# Altium footprint library Tomra_Cadstar_Footprints.PcbLib: 373 footprints (part 7 of 24)
Each footprint in its own frame and in the unit in brackets; x right, y up, seen from the top. Pads: shape width x height; smd on the part's side, far side on the other; paste and mask are expansions set on the pad; w line width, h text height; cw(c..) or ccw(c..) is an arc to the next point about the centre after c.
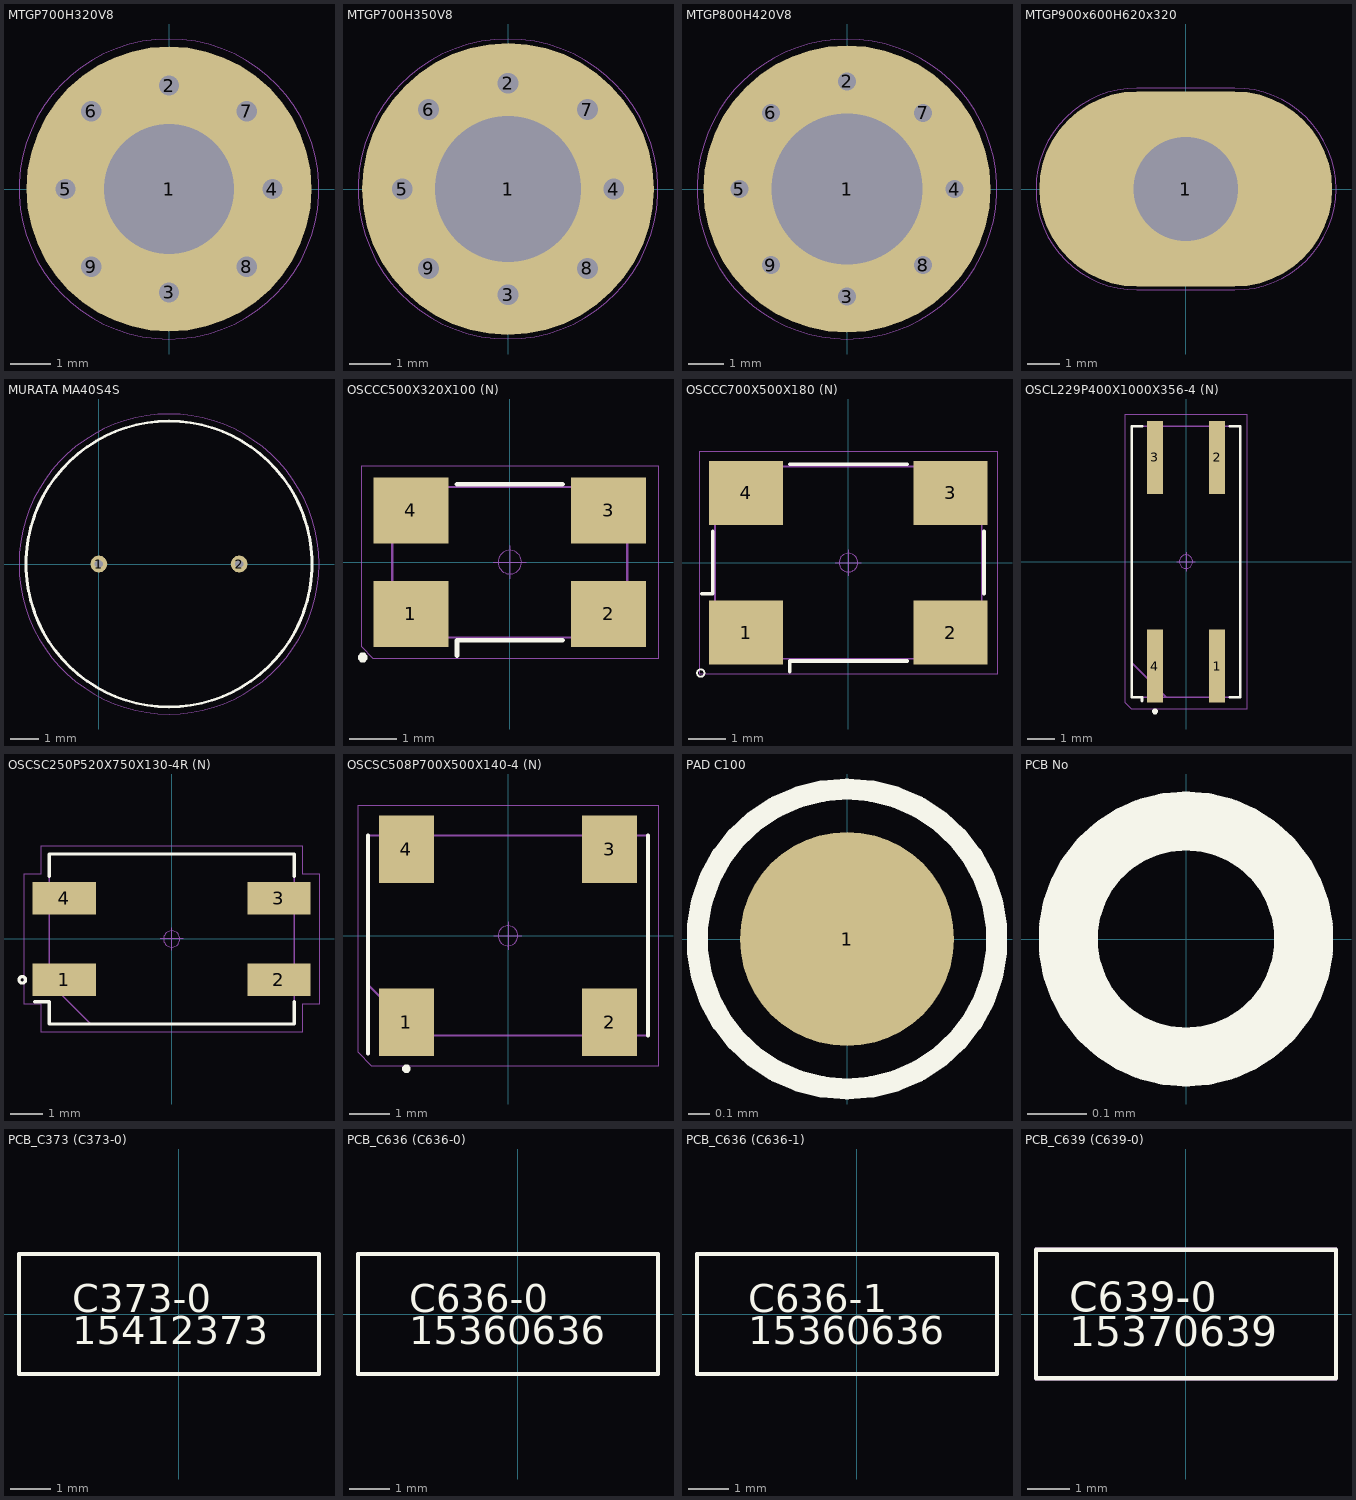
[diagram p6: the footprints below, top view; thin cyan lines are the x and y axes]

## MTGP700H320V8 [mm]
pads (9):
  round 7 / inner round 1.524 / far side round 7 hole 3.2 paste+0 mask+0: 1(0,0)
  round 0.9 / inner round 1.524 / far side round 0.9 hole 0.5 paste+0 mask+0: 2(0,2.54) 3(0,-2.54) 4(2.54,0) 5(-2.54,0) 6(-1.905,1.905) 7(1.905,1.905) 8(1.905,-1.905) 9(-1.905,-1.905)
Top Elec:
  lines w0.1: -1.905,1.905 -2.54,0 -1.905,-1.905 0,-2.54 1.905,-1.905 2.54,0 1.905,1.905 0,2.54 0,0
Top Assembly:
  lines w0.05: 0,-3.4 cw(c0,0) 0,3.4 cw(c0,0) 0,-3.4
  text ".Designator" at 0,3.683 h0.7
Top Placement:
  lines w0.01: 0,-3.683 cw(c0,0) 0,3.683 cw(c0,0) 0,-3.683

## MTGP700H350V8 [mm]
pads (9):
  round 7 / inner round 1.524 / far side round 7 hole 3.5 paste+0 mask+0: 1(0,0)
  round 0.9 / inner round 1.524 / far side round 0.9 hole 0.5 paste+0 mask+0: 2(0,2.54) 3(0,-2.54) 4(2.54,0) 5(-2.54,0) 6(-1.905,1.905) 7(1.905,1.905) 8(1.905,-1.905) 9(-1.905,-1.905)
Top Elec:
  lines w0.3: 0,0 0,2.54 ; 0,2.54 1.905,1.905 2.54,0 1.905,-1.905 0,-2.54 -1.905,-1.905 -2.54,0 -1.905,1.905 0,2.54
Top Assembly:
  lines w0.05: 0,-3.4 cw(c0,0) 0,3.4 cw(c0,0) 0,-3.4
  text ".Designator" at 0,3.6 h0.7
Top Placement:
  lines w0.01: 0,-3.6 cw(c0,0) 0,3.6 cw(c0,0) 0,-3.6

## MTGP800H420V8 [mm]
pads (9):
  round 8 / inner round 1.524 / far side round 8 hole 4.2 paste+0 mask+0: 1(0,0)
  round 0.9 / inner round 1.524 / far side round 0.9 hole 0.5 paste+0 mask+0: 2(0,3) 3(0,-3) 4(3,0) 5(-3,0) 6(-2.121,2.121) 7(2.12,2.12) 8(2.12,-2.12) 9(-2.12,-2.12)
Top Elec:
  lines w0.1: -2.121,2.121 -3,0 -2.12,-2.12 0,-3 2.12,-2.12 3,0 2.12,2.12 0,3 0,0
Top Assembly:
  lines w0.05: 0,-3.9 cw(c0,0) 0,3.9 cw(c0,0) 0,-3.9
  text ".Designator" at 0,3.683 h0.7
Top Placement:
  lines w0.01: 0,-4.18 cw(c0,0) 0,4.18 cw(c0,0) 0,-4.18

## MTGP900x600H620x320 [mm]
pads (1):
  oval 9x6 / inner round 1.524 / far side oval 9x6 hole 3.2 paste+0 mask+0: 1(0,0)
Top Silk:
  text ".Designator" at -1.5,3.1 h0.7
Top Assembly:
  lines w0.05: -1.5,-2.9 1.5,-2.9 ccw(c1.494,0) 1.5,2.9 -1.5,2.9 ccw(c-1.506,0) -1.5,-2.9
Top Placement:
  lines w0.01: -1.5,-3.1 1.5,-3.1 ccw(c1.519,0) 1.5,3.1 -1.5,3.1 ccw(c-1.501,0) -1.5,-3.1

## MURATA MA40S4S [mm]
height 7.4
pads (2):
  round 0.6 / inner round 1.524 / far side round 0.6 hole 0.3 paste+0 mask+0: 1(0,0) 2(5,0)
Top Silk:
  lines w0.1: 2.5,-5.1 cw(c2.5,0) 2.5,5.1 cw(c2.5,0) 2.5,-5.1
Top Assembly:
  lines w0.05: 2.5,-5.1 cw(c2.5,0) 2.5,5.1 cw(c2.5,0) 2.5,-5.1
Top Placement:
  lines w0.01: 2.5,-5.35 cw(c2.5,0) 2.5,5.35 cw(c2.5,0) 2.5,-5.35
  text ".Designator" at 2.5,5.1 h0.7

## OSCCC500X320X100 (N) [mm]
height 1
pads (4):
  rect 1.6x1.4 smd paste+0 mask+0: 1(-2.1,-1.1) 2(2.1,-1.1) 3(2.1,1.1) 4(-2.1,1.1)
Top Silk:
  region: -3.226,-2.026 -3.226,-1.985 -3.168,-1.926 -3.085,-1.926 -3.026,-1.985 -3.026,-2.026 -3.026,-2.068 -3.085,-2.126 -3.168,-2.126 -3.226,-2.068
  lines w0.1: -1.12,-1.99 -1.12,-1.66 1.12,-1.66 ; -1.12,1.66 1.12,1.66
  text ".Designator" at -3.599,-0.35 h0.7
Top Assembly:
  lines w0.05: -2.5,-0.533 -1.433,-1.6 2.5,-1.6 2.5,1.6 -2.5,1.6 -2.5,-0.533
Top Placement:
  lines w0.01: -0.35,0 0.35,0 ; 0,-0.35 0,0.35 ; -3.15,-1.8 -2.9,-2.05 3.15,-2.05 3.15,2.05 -3.15,2.05 -3.15,-1.8 ; -0.25,0 cw(c0,0) 0.25,0 cw(c0,0) -0.25,0

## OSCCC700X500X180 (N) [mm]
height 1.8
pads (4):
  rect 1.98x1.72 smd paste+0 mask+0: 1(-2.745,-1.875) 2(2.745,-1.875) 3(2.745,1.875) 4(-2.745,1.875)
Top Silk:
  lines w0.05: -4.061,-2.961 cw(c-3.961,-2.961) -3.861,-2.961 cw(c-3.961,-2.961) -4.061,-2.961
  lines w0.1: -3.93,-0.835 -3.64,-0.835 -3.64,0.835 ; -1.575,-2.93 -1.575,-2.64 1.575,-2.64 ; -1.575,2.64 1.575,2.64 ; 3.64,-0.835 3.64,0.835
  text ".Designator" at -3.99,2.99 h0.7
Top Assembly:
  lines w0.05: -3.58,-1.31 -2.31,-2.58 3.58,-2.58 3.58,2.58 -3.58,2.58 -3.58,-1.31
Top Placement:
  lines w0.01: -0.35,0 0.35,0 ; 0,-0.35 0,0.35 ; -3.99,-2.99 -3.99,2.99 3.99,2.99 3.99,-2.99 -3.99,-2.99 ; -0.25,0 cw(c0,0) 0.25,0 cw(c0,0) -0.25,0

## OSCL229P400X1000X356-4 (N) [mm]
height 3.56
pads (4):
  rect 0.6x2.7 smd paste+0 mask+0: 1(1.145,-3.85) 2(1.145,3.85) 3(-1.145,3.85) 4(-1.145,-3.85)
Top Silk:
  region: -1.245,-5.52 -1.245,-5.479 -1.186,-5.42 -1.104,-5.42 -1.045,-5.479 -1.045,-5.52 -1.045,-5.561 -1.104,-5.62 -1.186,-5.62 -1.245,-5.561
  lines w0.1: -1.625,-5.14 -1.625,-5 -2,-5 -2,5 -1.625,5 ; 1.625,-5 2,-5 2,5 1.625,5
  text ".Designator" at -3.599,-0.35 h0.7
Drill:
  lines w0.05: -2,-5 -2,5 2,5 2,-5 -2,-5
Top Assembly:
  lines w0.05: -2,-3.73 -0.73,-5 2,-5 2,5 -2,5 -2,-3.73
Top Placement:
  lines w0.01: -0.35,0 0.35,0 ; 0,-0.35 0,0.35 ; -2.25,-5.2 -2,-5.45 2.25,-5.45 2.25,5.45 -2.25,5.45 -2.25,-5.2 ; -0.25,0 cw(c0,0) 0.25,0 cw(c0,0) -0.25,0

## OSCSC250P520X750X130-4R (N) [mm]
height 1.3
pads (4):
  rrect0% 1.94x0.99 smd paste+0 mask+0: 1(-3.285,-1.25) 2(3.285,-1.25) 3(3.285,1.25) 4(-3.285,1.25)
Top Silk:
  lines w0.1: -4.195,-1.925 -3.75,-1.925 -3.75,-2.6 3.75,-2.6 3.75,-1.925 ; -3.75,1.925 -3.75,2.6 3.75,2.6 3.75,1.925 ; -4.675,-1.25 cw(c-4.575,-1.25) -4.475,-1.25 cw(c-4.575,-1.25) -4.675,-1.25
  text ".Designator" at -3.75,2.6 h0.7
Top Assembly:
  lines w0.05: -3.75,-1.33 -3.75,2.6 3.75,2.6 3.75,-2.6 -2.48,-2.6 -3.75,-1.33
Top Placement:
  lines w0.01: -0.25,0 cw(c0,0) 0.25,0 ; -0.25,0 ccw(c0,0) 0.25,0 ; -0.25,0 cw(c0,0) 0.25,0 ; -0.25,0 ccw(c0,0) 0.25,0 ; -4.51,-2 -4,-2 -4,-2.85 4,-2.85 4,-2 4.51,-2 4.51,2 4,2 4,2.85 -4,2.85 -4,2 -4.51,2 -4.51,-2 ; -0.35,0 0.35,0 -0.35,0 ; 0,-0.35 0,0.35 0,-0.35

## OSCSC508P700X500X140-4 (N) [mm]
height 1.4
pads (4):
  rect 1.37x1.69 smd paste+0 mask+0: 1(-2.54,-2.16) 2(2.54,-2.16) 3(2.54,2.16) 4(-2.54,2.16)
Top Silk:
  region: -2.64,-3.325 -2.64,-3.284 -2.581,-3.225 -2.499,-3.225 -2.44,-3.284 -2.44,-3.325 -2.44,-3.366 -2.499,-3.425 -2.581,-3.425 -2.64,-3.366
  lines w0.1: -3.5,-2.945 -3.5,2.5 ; 3.5,-2.5 3.5,2.5
  text ".Designator" at -3.599,-0.35 h0.7
Top Assembly:
  lines w0.05: -3.5,-1.23 -2.23,-2.5 3.5,-2.5 3.5,2.5 -3.5,2.5 -3.5,-1.23
Top Placement:
  lines w0.01: -0.35,0 0.35,0 ; 0,-0.35 0,0.35 ; -3.75,-2.91 -3.4,-3.26 3.75,-3.26 3.75,3.26 -3.75,3.26 -3.75,-2.91 ; -0.25,0 cw(c0,0) 0.25,0 cw(c0,0) -0.25,0

## PAD C100 [mm]
pads (1):
  round 1 smd paste+0 mask+0: 1(0,0)
Top Silk:
  lines w0.1: 0,-0.7 cw(c0,0) 0,0.7 cw(c0,0) 0,-0.7
Top Assembly:
  lines w0.05: 0,-0.4 cw(c0,0) 0,0.4 cw(c0,0) 0,-0.4
  text ".Designator" at 0,0.7 h0.7
Top Placement:
  lines w0.01: 0,-0.7 cw(c0,0) 0,0.7 cw(c0,0) 0,-0.7

## PCB No [mm]
Top Silk:
  lines w0.1: 0,-0.2 cw(c0,0) 0,0.2 cw(c0,0) 0,-0.2
  text ".Designator" at 0,0 h0.7

## PCB_C373 (C373-0) [mm]
height 0.1
Top Silk:
  lines w0.1: -4,-1.5 3.5,-1.5 3.5,1.5 -4,1.5 -4,-1.5
  text "15412373" at -2.666,-0.75 h0.7
  text "C373-0" at -2.666,0.05 h0.7
Top Placement:
  lines w0.1: -4,-1.5 3.5,-1.5 3.5,1.5 -4,1.5 -4,-1.5
  text "15412373" at -2.666,-0.75 h0.7
  text "C373-0" at -2.666,0.05 h0.7

## PCB_C636 (C636-0) [mm]
height 0.1
Top Silk:
  lines w0.1: -4,-1.5 3.5,-1.5 3.5,1.5 -4,1.5 -4,-1.5
  text "15360636" at -2.724,-0.75 h0.7
  text "C636-0" at -2.724,0.05 h0.7
Top Placement:
  lines w0.1: -4,-1.5 3.5,-1.5 3.5,1.5 -4,1.5 -4,-1.5
  text "15360636" at -2.724,-0.75 h0.7
  text "C636-0" at -2.724,0.05 h0.7

## PCB_C636 (C636-1) [mm]
height 0.1
Top Silk:
  lines w0.1: -4,-1.5 3.5,-1.5 3.5,1.5 -4,1.5 -4,-1.5
  text "15360636" at -2.724,-0.75 h0.7
  text "C636-1" at -2.724,0.05 h0.7
Top Placement:
  lines w0.1: -4,-1.5 3.5,-1.5 3.5,1.5 -4,1.5 -4,-1.5
  text "15360636" at -2.724,-0.75 h0.7
  text "C636-1" at -2.724,0.05 h0.7

## PCB_C639 (C639-0) [mm]
height 0.1
Top Silk:
  lines w0.1: -3.5,-1.5 3.5,-1.5 3.5,1.5 -3.5,1.5 -3.5,-1.5
  text "15370639" at -2.724,-0.75 h0.7
  text "C639-0" at -2.724,0.05 h0.7
Top Placement:
  lines w0.1: -3.5,-1.5 3.5,-1.5 3.5,1.5 -3.5,1.5 -3.5,-1.5
  text "15370639" at -2.724,-0.75 h0.7
  text "C639-0" at -2.724,0.05 h0.7